# Altium footprint library Connector_Samtec_HLE_THT.PcbLib: 141 footprints (part 4 of 9)
Each footprint in its own frame and in the unit in brackets; x right, y up, seen from the top. Pads: shape width x height; smd on the part's side, far side on the other; paste and mask are expansions set on the pad; w line width, h text height; cw(c..) or ccw(c..) is an arc to the next point about the centre after c.
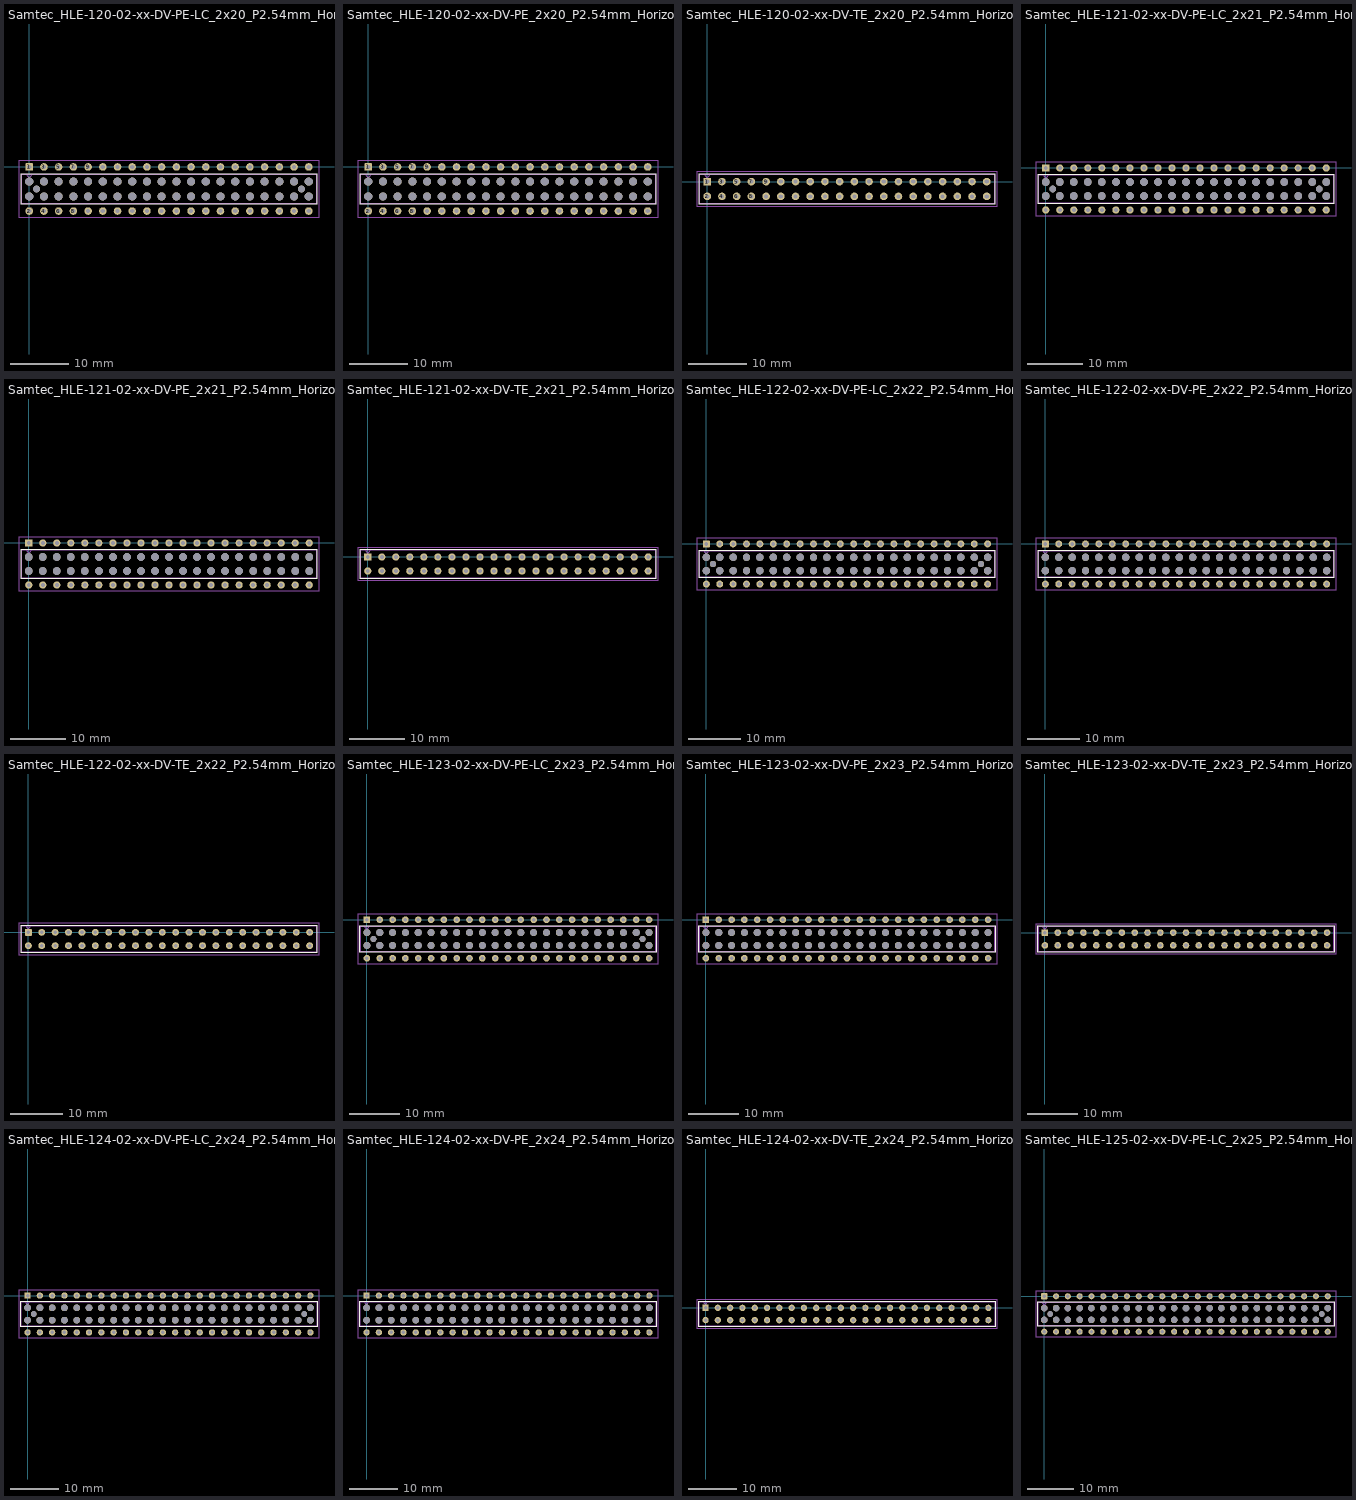
[diagram p3: the footprints below, top view; thin cyan lines are the x and y axes]

## Samtec_HLE-120-02-xx-DV-PE-LC_2x20_P2.54mm_Horizontal [mm]
pads (82):
  rrect19% 1.31x1.31 hole 0.71: 1(0,0)
  round 1.31 hole 0.71: 2(0,-7.62) 3(2.54,0) 4(2.54,-7.62) 5(5.08,0) 6(5.08,-7.62) 7(7.62,0) 8(7.62,-7.62) 9(10.16,0) 10(10.16,-7.62) 11(12.7,0) 12(12.7,-7.62) 13(15.24,0) 14(15.24,-7.62) 15(17.78,0) 16(17.78,-7.62) 17(20.32,0) 18(20.32,-7.62) 19(22.86,0) 20(22.86,-7.62) 21(25.4,0) 22(25.4,-7.62) 23(27.94,0) 24(27.94,-7.62) 25(30.48,0) 26(30.48,-7.62) 27(33.02,0) 28(33.02,-7.62) 29(35.56,0) 30(35.56,-7.62) 31(38.1,0) 32(38.1,-7.62) 33(40.64,0) 34(40.64,-7.62) 35(43.18,0) 36(43.18,-7.62) 37(45.72,0) 38(45.72,-7.62) 39(48.26,0) 40(48.26,-7.62)
  round 1.4 hole 1.4: Un1(48.26,-2.54) Un2(2.54,-2.54) Un3(40.64,-5.08) Un4(35.56,-5.08) Un5(40.64,-2.54) Un6(35.56,-2.54) Un7(10.16,-2.54) Un8(20.32,-2.54) Un9(0,-2.54) Un10(25.4,-5.08) Un11(43.18,-5.08) Un12(12.7,-5.08) Un14(38.1,-5.08) Un15(22.86,-2.54) Un16(38.1,-2.54) Un17(12.7,-2.54) Un18(27.94,-5.08) Un19(45.72,-5.08) Un20(17.78,-5.08) Un21(25.4,-2.54) Un22(48.26,-5.08) Un23(43.18,-2.54) Un24(30.48,-5.08) Un25(27.94,-2.54) Un26(33.02,-5.08) Un27(15.24,-2.54) Un28(7.62,-5.08) Un29(15.24,-5.08) Un30(22.86,-5.08) Un31(17.78,-2.54) Un32(45.72,-2.54) Un33(5.08,-5.08) Un34(30.48,-2.54) Un35(10.16,-5.08) Un36(33.02,-2.54) Un37(5.08,-2.54) Un39(7.62,-2.54) Un40(20.32,-5.08) Un41(0,-5.08) Un42(2.54,-5.08)
  round 1.19 hole 1.19: Un13(1.27,-3.81) Un38(46.99,-3.81)
F.SilkS:
  lines w0.12: -1.38,-6.46 49.64,-6.46 49.64,-1.16 -1.38,-1.16 -1.38,-6.46
F.CrtYd:
  lines w0.05: -1.77,-8.78 50.03,-8.78 50.03,1.16 -1.77,1.16 -1.77,-8.78
F.Fab:
  lines w0.1: -0.5,-1.27 0,-1.977 0.5,-1.27 ; -1.27,-6.35 49.53,-6.35 49.53,-1.27 -1.27,-1.27 -1.27,-6.35
  text "'.Designator'" at 20.083,-6.49 h1

## Samtec_HLE-120-02-xx-DV-PE_2x20_P2.54mm_Horizontal [mm]
pads (80):
  rrect19% 1.31x1.31 hole 0.71: 1(0,0)
  round 1.31 hole 0.71: 2(0,-7.62) 3(2.54,0) 4(2.54,-7.62) 5(5.08,0) 6(5.08,-7.62) 7(7.62,0) 8(7.62,-7.62) 9(10.16,0) 10(10.16,-7.62) 11(12.7,0) 12(12.7,-7.62) 13(15.24,0) 14(15.24,-7.62) 15(17.78,0) 16(17.78,-7.62) 17(20.32,0) 18(20.32,-7.62) 19(22.86,0) 20(22.86,-7.62) 21(25.4,0) 22(25.4,-7.62) 23(27.94,0) 24(27.94,-7.62) 25(30.48,0) 26(30.48,-7.62) 27(33.02,0) 28(33.02,-7.62) 29(35.56,0) 30(35.56,-7.62) 31(38.1,0) 32(38.1,-7.62) 33(40.64,0) 34(40.64,-7.62) 35(43.18,0) 36(43.18,-7.62) 37(45.72,0) 38(45.72,-7.62) 39(48.26,0) 40(48.26,-7.62)
  round 1.4 hole 1.4: Un1(20.32,-5.08) Un2(43.18,-5.08) Un3(2.54,-5.08) Un4(43.18,-2.54) Un5(48.26,-5.08) Un6(0,-2.54) Un7(35.56,-2.54) Un8(17.78,-5.08) Un9(38.1,-5.08) Un10(25.4,-2.54) Un11(22.86,-5.08) Un12(12.7,-2.54) Un13(45.72,-2.54) Un14(38.1,-2.54) Un15(12.7,-5.08) Un16(10.16,-5.08) Un17(0,-5.08) Un18(15.24,-2.54) Un19(2.54,-2.54) Un20(22.86,-2.54) Un21(7.62,-5.08) Un22(40.64,-2.54) Un23(48.26,-2.54) Un24(30.48,-2.54) Un25(5.08,-5.08) Un26(33.02,-2.54) Un27(7.62,-2.54) Un28(45.72,-5.08) Un29(27.94,-2.54) Un30(10.16,-2.54) Un31(25.4,-5.08) Un32(35.56,-5.08) Un33(17.78,-2.54) Un34(40.64,-5.08) Un35(15.24,-5.08) Un36(20.32,-2.54) Un37(30.48,-5.08) Un38(33.02,-5.08) Un39(5.08,-2.54) Un40(27.94,-5.08)
F.SilkS:
  lines w0.12: -1.38,-6.46 -1.38,-1.16 49.64,-1.16 49.64,-6.46 -1.38,-6.46
F.CrtYd:
  lines w0.05: -1.77,-8.78 50.03,-8.78 50.03,1.16 -1.77,1.16 -1.77,-8.78
F.Fab:
  lines w0.1: -0.5,-1.27 0,-1.977 0.5,-1.27 ; -1.27,-6.35 -1.27,-1.27 49.53,-1.27 49.53,-6.35 -1.27,-6.35
  text "'.Designator'" at 20.083,-6.49 h1

## Samtec_HLE-120-02-xx-DV-TE_2x20_P2.54mm_Horizontal [mm]
pads (40):
  rrect19% 1.31x1.31 hole 0.71: 1(0,0)
  round 1.31 hole 0.71: 2(0,-2.54) 3(2.54,0) 4(2.54,-2.54) 5(5.08,0) 6(5.08,-2.54) 7(7.62,0) 8(7.62,-2.54) 9(10.16,0) 10(10.16,-2.54) 11(12.7,0) 12(12.7,-2.54) 13(15.24,0) 14(15.24,-2.54) 15(17.78,0) 16(17.78,-2.54) 17(20.32,0) 18(20.32,-2.54) 19(22.86,0) 20(22.86,-2.54) 21(25.4,0) 22(25.4,-2.54) 23(27.94,0) 24(27.94,-2.54) 25(30.48,0) 26(30.48,-2.54) 27(33.02,0) 28(33.02,-2.54) 29(35.56,0) 30(35.56,-2.54) 31(38.1,0) 32(38.1,-2.54) 33(40.64,0) 34(40.64,-2.54) 35(43.18,0) 36(43.18,-2.54) 37(45.72,0) 38(45.72,-2.54) 39(48.26,0) 40(48.26,-2.54)
F.SilkS:
  lines w0.12: -1.38,-3.92 49.64,-3.92 49.64,1.38 -1.38,1.38 -1.38,-3.92
F.CrtYd:
  lines w0.05: -1.77,-4.31 -1.77,1.77 50.03,1.77 50.03,-4.31 -1.77,-4.31
F.Fab:
  lines w0.1: -0.5,1.27 0,0.563 0.5,1.27 ; -1.27,-3.81 -1.27,1.27 49.53,1.27 49.53,-3.81 -1.27,-3.81
  text "'.Designator'" at 20.083,-3.95 h1

## Samtec_HLE-121-02-xx-DV-PE-LC_2x21_P2.54mm_Horizontal [mm]
pads (86):
  rrect19% 1.31x1.31 hole 0.71: 1(0,0)
  round 1.31 hole 0.71: 2(0,-7.62) 3(2.54,0) 4(2.54,-7.62) 5(5.08,0) 6(5.08,-7.62) 7(7.62,0) 8(7.62,-7.62) 9(10.16,0) 10(10.16,-7.62) 11(12.7,0) 12(12.7,-7.62) 13(15.24,0) 14(15.24,-7.62) 15(17.78,0) 16(17.78,-7.62) 17(20.32,0) 18(20.32,-7.62) 19(22.86,0) 20(22.86,-7.62) 21(25.4,0) 22(25.4,-7.62) 23(27.94,0) 24(27.94,-7.62) 25(30.48,0) 26(30.48,-7.62) 27(33.02,0) 28(33.02,-7.62) 29(35.56,0) 30(35.56,-7.62) 31(38.1,0) 32(38.1,-7.62) 33(40.64,0) 34(40.64,-7.62) 35(43.18,0) 36(43.18,-7.62) 37(45.72,0) 38(45.72,-7.62) 39(48.26,0) 40(48.26,-7.62) 41(50.8,0) 42(50.8,-7.62)
  round 1.19 hole 1.19: Un1(1.27,-3.81) Un37(49.53,-3.81)
  round 1.4 hole 1.4: Un2(2.54,-2.54) Un3(15.24,-5.08) Un4(17.78,-2.54) Un5(27.94,-5.08) Un6(0,-2.54) Un7(48.26,-2.54) Un8(33.02,-2.54) Un9(38.1,-2.54) Un10(50.8,-5.08) Un11(35.56,-5.08) Un12(20.32,-5.08) Un13(45.72,-2.54) Un14(35.56,-2.54) Un15(43.18,-2.54) Un16(0,-5.08) Un17(38.1,-5.08) Un18(15.24,-2.54) Un19(10.16,-2.54) Un20(40.64,-5.08) Un21(30.48,-5.08) Un22(45.72,-5.08) Un23(48.26,-5.08) Un24(12.7,-5.08) Un25(20.32,-2.54) Un26(12.7,-2.54) Un27(40.64,-2.54) Un28(33.02,-5.08) Un29(22.86,-2.54) Un30(27.94,-2.54) Un31(17.78,-5.08) Un32(25.4,-5.08) Un33(30.48,-2.54) Un34(7.62,-5.08) Un35(22.86,-5.08) Un36(50.8,-2.54) Un38(2.54,-5.08) Un39(10.16,-5.08) Un40(25.4,-2.54) Un41(5.08,-2.54) Un42(43.18,-5.08) Un43(7.62,-2.54) Un44(5.08,-5.08)
F.SilkS:
  lines w0.12: -1.38,-6.46 52.18,-6.46 52.18,-1.16 -1.38,-1.16 -1.38,-6.46
F.CrtYd:
  lines w0.05: -1.77,-8.78 52.57,-8.78 52.57,1.16 -1.77,1.16 -1.77,-8.78
F.Fab:
  lines w0.1: -0.5,-1.27 0,-1.977 0.5,-1.27 ; -1.27,-6.35 52.07,-6.35 52.07,-1.27 -1.27,-1.27 -1.27,-6.35
  text "'.Designator'" at 21.353,-6.49 h1

## Samtec_HLE-121-02-xx-DV-PE_2x21_P2.54mm_Horizontal [mm]
pads (84):
  rrect19% 1.31x1.31 hole 0.71: 1(0,0)
  round 1.31 hole 0.71: 2(0,-7.62) 3(2.54,0) 4(2.54,-7.62) 5(5.08,0) 6(5.08,-7.62) 7(7.62,0) 8(7.62,-7.62) 9(10.16,0) 10(10.16,-7.62) 11(12.7,0) 12(12.7,-7.62) 13(15.24,0) 14(15.24,-7.62) 15(17.78,0) 16(17.78,-7.62) 17(20.32,0) 18(20.32,-7.62) 19(22.86,0) 20(22.86,-7.62) 21(25.4,0) 22(25.4,-7.62) 23(27.94,0) 24(27.94,-7.62) 25(30.48,0) 26(30.48,-7.62) 27(33.02,0) 28(33.02,-7.62) 29(35.56,0) 30(35.56,-7.62) 31(38.1,0) 32(38.1,-7.62) 33(40.64,0) 34(40.64,-7.62) 35(43.18,0) 36(43.18,-7.62) 37(45.72,0) 38(45.72,-7.62) 39(48.26,0) 40(48.26,-7.62) 41(50.8,0) 42(50.8,-7.62)
  round 1.4 hole 1.4: Un1(15.24,-2.54) Un2(48.26,-2.54) Un3(35.56,-5.08) Un4(33.02,-2.54) Un5(0,-5.08) Un6(10.16,-5.08) Un7(15.24,-5.08) Un8(5.08,-2.54) Un9(48.26,-5.08) Un10(7.62,-5.08) Un11(43.18,-2.54) Un12(10.16,-2.54) Un13(45.72,-5.08) Un14(50.8,-5.08) Un15(25.4,-2.54) Un16(5.08,-5.08) Un17(20.32,-5.08) Un18(33.02,-5.08) Un19(35.56,-2.54) Un20(43.18,-5.08) Un21(30.48,-5.08) Un22(27.94,-5.08) Un23(0,-2.54) Un24(25.4,-5.08) Un25(20.32,-2.54) Un26(12.7,-2.54) Un27(2.54,-2.54) Un28(27.94,-2.54) Un29(2.54,-5.08) Un30(30.48,-2.54) Un31(22.86,-5.08) Un32(50.8,-2.54) Un33(22.86,-2.54) Un34(7.62,-2.54) Un35(17.78,-5.08) Un36(40.64,-5.08) Un37(45.72,-2.54) Un38(38.1,-2.54) Un39(12.7,-5.08) Un40(38.1,-5.08) Un41(17.78,-2.54) Un42(40.64,-2.54)
F.SilkS:
  lines w0.12: -1.38,-6.46 52.18,-6.46 52.18,-1.16 -1.38,-1.16 -1.38,-6.46
F.CrtYd:
  lines w0.05: -1.77,-8.78 -1.77,1.16 52.57,1.16 52.57,-8.78 -1.77,-8.78
F.Fab:
  lines w0.1: -0.5,-1.27 0,-1.977 0.5,-1.27 ; -1.27,-6.35 52.07,-6.35 52.07,-1.27 -1.27,-1.27 -1.27,-6.35
  text "'.Designator'" at 21.353,-6.49 h1

## Samtec_HLE-121-02-xx-DV-TE_2x21_P2.54mm_Horizontal [mm]
pads (42):
  rrect19% 1.31x1.31 hole 0.71: 1(0,0)
  round 1.31 hole 0.71: 2(0,-2.54) 3(2.54,0) 4(2.54,-2.54) 5(5.08,0) 6(5.08,-2.54) 7(7.62,0) 8(7.62,-2.54) 9(10.16,0) 10(10.16,-2.54) 11(12.7,0) 12(12.7,-2.54) 13(15.24,0) 14(15.24,-2.54) 15(17.78,0) 16(17.78,-2.54) 17(20.32,0) 18(20.32,-2.54) 19(22.86,0) 20(22.86,-2.54) 21(25.4,0) 22(25.4,-2.54) 23(27.94,0) 24(27.94,-2.54) 25(30.48,0) 26(30.48,-2.54) 27(33.02,0) 28(33.02,-2.54) 29(35.56,0) 30(35.56,-2.54) 31(38.1,0) 32(38.1,-2.54) 33(40.64,0) 34(40.64,-2.54) 35(43.18,0) 36(43.18,-2.54) 37(45.72,0) 38(45.72,-2.54) 39(48.26,0) 40(48.26,-2.54) 41(50.8,0) 42(50.8,-2.54)
F.SilkS:
  lines w0.12: -1.38,-3.92 52.18,-3.92 52.18,1.38 -1.38,1.38 -1.38,-3.92
F.CrtYd:
  lines w0.05: -1.77,-4.31 52.57,-4.31 52.57,1.77 -1.77,1.77 -1.77,-4.31
F.Fab:
  lines w0.1: -0.5,1.27 0,0.563 0.5,1.27 ; -1.27,-3.81 52.07,-3.81 52.07,1.27 -1.27,1.27 -1.27,-3.81
  text "'.Designator'" at 21.353,-3.95 h1

## Samtec_HLE-122-02-xx-DV-PE-LC_2x22_P2.54mm_Horizontal [mm]
pads (90):
  rrect19% 1.31x1.31 hole 0.71: 1(0,0)
  round 1.31 hole 0.71: 2(0,-7.62) 3(2.54,0) 4(2.54,-7.62) 5(5.08,0) 6(5.08,-7.62) 7(7.62,0) 8(7.62,-7.62) 9(10.16,0) 10(10.16,-7.62) 11(12.7,0) 12(12.7,-7.62) 13(15.24,0) 14(15.24,-7.62) 15(17.78,0) 16(17.78,-7.62) 17(20.32,0) 18(20.32,-7.62) 19(22.86,0) 20(22.86,-7.62) 21(25.4,0) 22(25.4,-7.62) 23(27.94,0) 24(27.94,-7.62) 25(30.48,0) 26(30.48,-7.62) 27(33.02,0) 28(33.02,-7.62) 29(35.56,0) 30(35.56,-7.62) 31(38.1,0) 32(38.1,-7.62) 33(40.64,0) 34(40.64,-7.62) 35(43.18,0) 36(43.18,-7.62) 37(45.72,0) 38(45.72,-7.62) 39(48.26,0) 40(48.26,-7.62) 41(50.8,0) 42(50.8,-7.62) 43(53.34,0) 44(53.34,-7.62)
  round 1.4 hole 1.4: Un1(27.94,-2.54) Un2(7.62,-5.08) Un3(15.24,-2.54) Un4(0,-5.08) Un5(35.56,-2.54) Un6(30.48,-2.54) Un7(17.78,-2.54) Un8(22.86,-2.54) Un9(12.7,-5.08) Un10(25.4,-2.54) Un11(15.24,-5.08) Un12(20.32,-5.08) Un13(38.1,-2.54) Un14(0,-2.54) Un15(7.62,-2.54) Un16(38.1,-5.08) Un17(25.4,-5.08) Un18(48.26,-5.08) Un20(30.48,-5.08) Un21(10.16,-5.08) Un22(5.08,-2.54) Un23(45.72,-5.08) Un24(10.16,-2.54) Un25(2.54,-5.08) Un26(45.72,-2.54) Un27(50.8,-5.08) Un28(17.78,-5.08) Un29(12.7,-2.54) Un30(2.54,-2.54) Un31(5.08,-5.08) Un33(53.34,-5.08) Un34(50.8,-2.54) Un35(43.18,-5.08) Un36(53.34,-2.54) Un37(40.64,-2.54) Un38(43.18,-2.54) Un39(20.32,-2.54) Un40(48.26,-2.54) Un41(40.64,-5.08) Un42(35.56,-5.08) Un43(33.02,-2.54) Un44(22.86,-5.08) Un45(27.94,-5.08) Un46(33.02,-5.08)
  round 1.19 hole 1.19: Un19(52.07,-3.81) Un32(1.27,-3.81)
F.SilkS:
  lines w0.12: -1.38,-6.46 -1.38,-1.16 54.72,-1.16 54.72,-6.46 -1.38,-6.46
F.CrtYd:
  lines w0.05: -1.77,-8.78 55.11,-8.78 55.11,1.16 -1.77,1.16 -1.77,-8.78
F.Fab:
  lines w0.1: -0.5,-1.27 0,-1.977 0.5,-1.27 ; -1.27,-6.35 -1.27,-1.27 54.61,-1.27 54.61,-6.35 -1.27,-6.35
  text "'.Designator'" at 22.623,-6.49 h1

## Samtec_HLE-122-02-xx-DV-PE_2x22_P2.54mm_Horizontal [mm]
pads (88):
  rrect19% 1.31x1.31 hole 0.71: 1(0,0)
  round 1.31 hole 0.71: 2(0,-7.62) 3(2.54,0) 4(2.54,-7.62) 5(5.08,0) 6(5.08,-7.62) 7(7.62,0) 8(7.62,-7.62) 9(10.16,0) 10(10.16,-7.62) 11(12.7,0) 12(12.7,-7.62) 13(15.24,0) 14(15.24,-7.62) 15(17.78,0) 16(17.78,-7.62) 17(20.32,0) 18(20.32,-7.62) 19(22.86,0) 20(22.86,-7.62) 21(25.4,0) 22(25.4,-7.62) 23(27.94,0) 24(27.94,-7.62) 25(30.48,0) 26(30.48,-7.62) 27(33.02,0) 28(33.02,-7.62) 29(35.56,0) 30(35.56,-7.62) 31(38.1,0) 32(38.1,-7.62) 33(40.64,0) 34(40.64,-7.62) 35(43.18,0) 36(43.18,-7.62) 37(45.72,0) 38(45.72,-7.62) 39(48.26,0) 40(48.26,-7.62) 41(50.8,0) 42(50.8,-7.62) 43(53.34,0) 44(53.34,-7.62)
  round 1.4 hole 1.4: Un1(45.72,-2.54) Un2(50.8,-5.08) Un3(30.48,-5.08) Un4(20.32,-5.08) Un5(22.86,-2.54) Un6(12.7,-5.08) Un7(0,-5.08) Un8(2.54,-5.08) Un9(10.16,-5.08) Un10(2.54,-2.54) Un11(33.02,-5.08) Un12(10.16,-2.54) Un13(27.94,-2.54) Un14(38.1,-2.54) Un15(30.48,-2.54) Un16(40.64,-2.54) Un17(53.34,-2.54) Un18(15.24,-5.08) Un19(40.64,-5.08) Un20(35.56,-5.08) Un21(33.02,-2.54) Un22(43.18,-2.54) Un23(53.34,-5.08) Un24(48.26,-5.08) Un25(25.4,-2.54) Un26(17.78,-5.08) Un27(0,-2.54) Un28(43.18,-5.08) Un29(12.7,-2.54) Un30(45.72,-5.08) Un31(5.08,-2.54) Un32(48.26,-2.54) Un33(7.62,-5.08) Un34(50.8,-2.54) Un35(5.08,-5.08) Un36(20.32,-2.54) Un37(27.94,-5.08) Un38(15.24,-2.54) Un39(22.86,-5.08) Un40(17.78,-2.54) Un41(25.4,-5.08) Un42(35.56,-2.54) Un43(7.62,-2.54) Un44(38.1,-5.08)
F.SilkS:
  lines w0.12: -1.38,-6.46 54.72,-6.46 54.72,-1.16 -1.38,-1.16 -1.38,-6.46
F.CrtYd:
  lines w0.05: -1.77,-8.78 55.11,-8.78 55.11,1.16 -1.77,1.16 -1.77,-8.78
F.Fab:
  lines w0.1: -0.5,-1.27 0,-1.977 0.5,-1.27 ; -1.27,-6.35 -1.27,-1.27 54.61,-1.27 54.61,-6.35 -1.27,-6.35
  text "'.Designator'" at 22.623,-6.49 h1

## Samtec_HLE-122-02-xx-DV-TE_2x22_P2.54mm_Horizontal [mm]
pads (44):
  rrect19% 1.31x1.31 hole 0.71: 1(0,0)
  round 1.31 hole 0.71: 2(0,-2.54) 3(2.54,0) 4(2.54,-2.54) 5(5.08,0) 6(5.08,-2.54) 7(7.62,0) 8(7.62,-2.54) 9(10.16,0) 10(10.16,-2.54) 11(12.7,0) 12(12.7,-2.54) 13(15.24,0) 14(15.24,-2.54) 15(17.78,0) 16(17.78,-2.54) 17(20.32,0) 18(20.32,-2.54) 19(22.86,0) 20(22.86,-2.54) 21(25.4,0) 22(25.4,-2.54) 23(27.94,0) 24(27.94,-2.54) 25(30.48,0) 26(30.48,-2.54) 27(33.02,0) 28(33.02,-2.54) 29(35.56,0) 30(35.56,-2.54) 31(38.1,0) 32(38.1,-2.54) 33(40.64,0) 34(40.64,-2.54) 35(43.18,0) 36(43.18,-2.54) 37(45.72,0) 38(45.72,-2.54) 39(48.26,0) 40(48.26,-2.54) 41(50.8,0) 42(50.8,-2.54) 43(53.34,0) 44(53.34,-2.54)
F.SilkS:
  lines w0.12: -1.38,-3.92 54.72,-3.92 54.72,1.38 -1.38,1.38 -1.38,-3.92
F.CrtYd:
  lines w0.05: -1.77,-4.31 -1.77,1.77 55.11,1.77 55.11,-4.31 -1.77,-4.31
F.Fab:
  lines w0.1: -0.5,1.27 0,0.563 0.5,1.27 ; -1.27,-3.81 -1.27,1.27 54.61,1.27 54.61,-3.81 -1.27,-3.81
  text "'.Designator'" at 22.623,-3.95 h1

## Samtec_HLE-123-02-xx-DV-PE-LC_2x23_P2.54mm_Horizontal [mm]
pads (94):
  rrect19% 1.31x1.31 hole 0.71: 1(0,0)
  round 1.31 hole 0.71: 2(0,-7.62) 3(2.54,0) 4(2.54,-7.62) 5(5.08,0) 6(5.08,-7.62) 7(7.62,0) 8(7.62,-7.62) 9(10.16,0) 10(10.16,-7.62) 11(12.7,0) 12(12.7,-7.62) 13(15.24,0) 14(15.24,-7.62) 15(17.78,0) 16(17.78,-7.62) 17(20.32,0) 18(20.32,-7.62) 19(22.86,0) 20(22.86,-7.62) 21(25.4,0) 22(25.4,-7.62) 23(27.94,0) 24(27.94,-7.62) 25(30.48,0) 26(30.48,-7.62) 27(33.02,0) 28(33.02,-7.62) 29(35.56,0) 30(35.56,-7.62) 31(38.1,0) 32(38.1,-7.62) 33(40.64,0) 34(40.64,-7.62) 35(43.18,0) 36(43.18,-7.62) 37(45.72,0) 38(45.72,-7.62) 39(48.26,0) 40(48.26,-7.62) 41(50.8,0) 42(50.8,-7.62) 43(53.34,0) 44(53.34,-7.62) 45(55.88,0) 46(55.88,-7.62)
  round 1.4 hole 1.4: Un1(43.18,-5.08) Un2(5.08,-2.54) Un3(2.54,-2.54) Un4(10.16,-2.54) Un5(53.34,-5.08) Un6(7.62,-2.54) Un7(17.78,-5.08) Un8(40.64,-2.54) Un9(27.94,-5.08) Un10(0,-5.08) Un11(22.86,-2.54) Un12(55.88,-5.08) Un13(7.62,-5.08) Un14(48.26,-2.54) Un15(0,-2.54) Un16(48.26,-5.08) Un17(30.48,-5.08) Un18(30.48,-2.54) Un19(12.7,-2.54) Un20(15.24,-5.08) Un21(45.72,-2.54) Un23(25.4,-2.54) Un24(12.7,-5.08) Un25(38.1,-5.08) Un27(20.32,-2.54) Un28(43.18,-2.54) Un29(10.16,-5.08) Un30(35.56,-5.08) Un31(27.94,-2.54) Un32(15.24,-2.54) Un33(40.64,-5.08) Un34(25.4,-5.08) Un35(45.72,-5.08) Un36(33.02,-5.08) Un37(5.08,-5.08) Un38(22.86,-5.08) Un39(33.02,-2.54) Un40(55.88,-2.54) Un41(20.32,-5.08) Un42(38.1,-2.54) Un43(17.78,-2.54) Un44(50.8,-2.54) Un45(2.54,-5.08) Un46(35.56,-2.54) Un47(50.8,-5.08) Un48(53.34,-2.54)
  round 1.19 hole 1.19: Un22(54.61,-3.81) Un26(1.27,-3.81)
F.SilkS:
  lines w0.12: -1.38,-6.46 -1.38,-1.16 57.26,-1.16 57.26,-6.46 -1.38,-6.46
F.CrtYd:
  lines w0.05: -1.77,-8.78 -1.77,1.16 57.65,1.16 57.65,-8.78 -1.77,-8.78
F.Fab:
  lines w0.1: -0.5,-1.27 0,-1.977 0.5,-1.27 ; -1.27,-6.35 57.15,-6.35 57.15,-1.27 -1.27,-1.27 -1.27,-6.35
  text "'.Designator'" at 23.893,-6.49 h1

## Samtec_HLE-123-02-xx-DV-PE_2x23_P2.54mm_Horizontal [mm]
pads (92):
  rrect19% 1.31x1.31 hole 0.71: 1(0,0)
  round 1.31 hole 0.71: 2(0,-7.62) 3(2.54,0) 4(2.54,-7.62) 5(5.08,0) 6(5.08,-7.62) 7(7.62,0) 8(7.62,-7.62) 9(10.16,0) 10(10.16,-7.62) 11(12.7,0) 12(12.7,-7.62) 13(15.24,0) 14(15.24,-7.62) 15(17.78,0) 16(17.78,-7.62) 17(20.32,0) 18(20.32,-7.62) 19(22.86,0) 20(22.86,-7.62) 21(25.4,0) 22(25.4,-7.62) 23(27.94,0) 24(27.94,-7.62) 25(30.48,0) 26(30.48,-7.62) 27(33.02,0) 28(33.02,-7.62) 29(35.56,0) 30(35.56,-7.62) 31(38.1,0) 32(38.1,-7.62) 33(40.64,0) 34(40.64,-7.62) 35(43.18,0) 36(43.18,-7.62) 37(45.72,0) 38(45.72,-7.62) 39(48.26,0) 40(48.26,-7.62) 41(50.8,0) 42(50.8,-7.62) 43(53.34,0) 44(53.34,-7.62) 45(55.88,0) 46(55.88,-7.62)
  round 1.4 hole 1.4: Un1(35.56,-5.08) Un2(40.64,-5.08) Un3(10.16,-5.08) Un4(7.62,-5.08) Un5(50.8,-2.54) Un6(53.34,-5.08) Un7(45.72,-5.08) Un8(5.08,-2.54) Un9(2.54,-2.54) Un10(2.54,-5.08) Un11(17.78,-5.08) Un12(30.48,-2.54) Un13(38.1,-2.54) Un14(25.4,-2.54) Un15(33.02,-5.08) Un16(25.4,-5.08) Un17(43.18,-2.54) Un18(38.1,-5.08) Un19(33.02,-2.54) Un20(15.24,-5.08) Un21(17.78,-2.54) Un22(22.86,-5.08) Un23(45.72,-2.54) Un24(55.88,-5.08) Un25(22.86,-2.54) Un26(30.48,-5.08) Un27(7.62,-2.54) Un28(20.32,-5.08) Un29(5.08,-5.08) Un30(53.34,-2.54) Un31(20.32,-2.54) Un32(12.7,-5.08) Un33(40.64,-2.54) Un34(35.56,-2.54) Un35(43.18,-5.08) Un36(0,-2.54) Un37(50.8,-5.08) Un38(55.88,-2.54) Un39(15.24,-2.54) Un40(27.94,-5.08) Un41(48.26,-5.08) Un42(12.7,-2.54) Un43(0,-5.08) Un44(48.26,-2.54) Un45(10.16,-2.54) Un46(27.94,-2.54)
F.SilkS:
  lines w0.12: -1.38,-6.46 -1.38,-1.16 57.26,-1.16 57.26,-6.46 -1.38,-6.46
F.CrtYd:
  lines w0.05: -1.77,-8.78 -1.77,1.16 57.65,1.16 57.65,-8.78 -1.77,-8.78
F.Fab:
  lines w0.1: -0.5,-1.27 0,-1.977 0.5,-1.27 ; -1.27,-6.35 57.15,-6.35 57.15,-1.27 -1.27,-1.27 -1.27,-6.35
  text "'.Designator'" at 23.893,-6.49 h1

## Samtec_HLE-123-02-xx-DV-TE_2x23_P2.54mm_Horizontal [mm]
pads (46):
  rrect19% 1.31x1.31 hole 0.71: 1(0,0)
  round 1.31 hole 0.71: 2(0,-2.54) 3(2.54,0) 4(2.54,-2.54) 5(5.08,0) 6(5.08,-2.54) 7(7.62,0) 8(7.62,-2.54) 9(10.16,0) 10(10.16,-2.54) 11(12.7,0) 12(12.7,-2.54) 13(15.24,0) 14(15.24,-2.54) 15(17.78,0) 16(17.78,-2.54) 17(20.32,0) 18(20.32,-2.54) 19(22.86,0) 20(22.86,-2.54) 21(25.4,0) 22(25.4,-2.54) 23(27.94,0) 24(27.94,-2.54) 25(30.48,0) 26(30.48,-2.54) 27(33.02,0) 28(33.02,-2.54) 29(35.56,0) 30(35.56,-2.54) 31(38.1,0) 32(38.1,-2.54) 33(40.64,0) 34(40.64,-2.54) 35(43.18,0) 36(43.18,-2.54) 37(45.72,0) 38(45.72,-2.54) 39(48.26,0) 40(48.26,-2.54) 41(50.8,0) 42(50.8,-2.54) 43(53.34,0) 44(53.34,-2.54) 45(55.88,0) 46(55.88,-2.54)
F.SilkS:
  lines w0.12: -1.38,-3.92 -1.38,1.38 57.26,1.38 57.26,-3.92 -1.38,-3.92
F.CrtYd:
  lines w0.05: -1.77,-4.31 -1.77,1.77 57.65,1.77 57.65,-4.31 -1.77,-4.31
F.Fab:
  lines w0.1: -0.5,1.27 0,0.563 0.5,1.27 ; -1.27,-3.81 57.15,-3.81 57.15,1.27 -1.27,1.27 -1.27,-3.81
  text "'.Designator'" at 23.893,-3.95 h1

## Samtec_HLE-124-02-xx-DV-PE-LC_2x24_P2.54mm_Horizontal [mm]
pads (98):
  rrect19% 1.31x1.31 hole 0.71: 1(0,0)
  round 1.31 hole 0.71: 2(0,-7.62) 3(2.54,0) 4(2.54,-7.62) 5(5.08,0) 6(5.08,-7.62) 7(7.62,0) 8(7.62,-7.62) 9(10.16,0) 10(10.16,-7.62) 11(12.7,0) 12(12.7,-7.62) 13(15.24,0) 14(15.24,-7.62) 15(17.78,0) 16(17.78,-7.62) 17(20.32,0) 18(20.32,-7.62) 19(22.86,0) 20(22.86,-7.62) 21(25.4,0) 22(25.4,-7.62) 23(27.94,0) 24(27.94,-7.62) 25(30.48,0) 26(30.48,-7.62) 27(33.02,0) 28(33.02,-7.62) 29(35.56,0) 30(35.56,-7.62) 31(38.1,0) 32(38.1,-7.62) 33(40.64,0) 34(40.64,-7.62) 35(43.18,0) 36(43.18,-7.62) 37(45.72,0) 38(45.72,-7.62) 39(48.26,0) 40(48.26,-7.62) 41(50.8,0) 42(50.8,-7.62) 43(53.34,0) 44(53.34,-7.62) 45(55.88,0) 46(55.88,-7.62) 47(58.42,0) 48(58.42,-7.62)
  round 1.4 hole 1.4: Un1(12.7,-2.54) Un2(58.42,-5.08) Un3(0,-5.08) Un4(33.02,-5.08) Un5(7.62,-5.08) Un6(5.08,-2.54) Un7(20.32,-2.54) Un8(15.24,-5.08) Un9(27.94,-2.54) Un10(2.54,-2.54) Un11(15.24,-2.54) Un12(30.48,-2.54) Un13(0,-2.54) Un14(10.16,-2.54) Un16(58.42,-2.54) Un17(35.56,-5.08) Un18(33.02,-2.54) Un20(17.78,-5.08) Un21(50.8,-2.54) Un22(35.56,-2.54) Un23(25.4,-2.54) Un24(38.1,-5.08) Un25(30.48,-5.08) Un26(27.94,-5.08) Un27(20.32,-5.08) Un28(40.64,-2.54) Un29(12.7,-5.08) Un30(55.88,-2.54) Un31(38.1,-2.54) Un32(55.88,-5.08) Un33(17.78,-2.54) Un34(7.62,-2.54) Un35(5.08,-5.08) Un36(48.26,-2.54) Un37(43.18,-5.08) Un38(10.16,-5.08) Un39(50.8,-5.08) Un40(48.26,-5.08) Un41(45.72,-5.08) Un42(45.72,-2.54) Un43(22.86,-5.08) Un44(53.34,-5.08) Un45(43.18,-2.54) Un46(22.86,-2.54) Un47(53.34,-2.54) Un48(25.4,-5.08) Un49(2.54,-5.08) Un50(40.64,-5.08)
  round 1.19 hole 1.19: Un15(57.15,-3.81) Un19(1.27,-3.81)
F.SilkS:
  lines w0.12: -1.38,-6.46 -1.38,-1.16 59.8,-1.16 59.8,-6.46 -1.38,-6.46
F.CrtYd:
  lines w0.05: -1.77,-8.78 -1.77,1.16 60.19,1.16 60.19,-8.78 -1.77,-8.78
F.Fab:
  lines w0.1: -0.5,-1.27 0,-1.977 0.5,-1.27 ; -1.27,-6.35 -1.27,-1.27 59.69,-1.27 59.69,-6.35 -1.27,-6.35
  text "'.Designator'" at 25.163,-6.49 h1

## Samtec_HLE-124-02-xx-DV-PE_2x24_P2.54mm_Horizontal [mm]
pads (96):
  rrect19% 1.31x1.31 hole 0.71: 1(0,0)
  round 1.31 hole 0.71: 2(0,-7.62) 3(2.54,0) 4(2.54,-7.62) 5(5.08,0) 6(5.08,-7.62) 7(7.62,0) 8(7.62,-7.62) 9(10.16,0) 10(10.16,-7.62) 11(12.7,0) 12(12.7,-7.62) 13(15.24,0) 14(15.24,-7.62) 15(17.78,0) 16(17.78,-7.62) 17(20.32,0) 18(20.32,-7.62) 19(22.86,0) 20(22.86,-7.62) 21(25.4,0) 22(25.4,-7.62) 23(27.94,0) 24(27.94,-7.62) 25(30.48,0) 26(30.48,-7.62) 27(33.02,0) 28(33.02,-7.62) 29(35.56,0) 30(35.56,-7.62) 31(38.1,0) 32(38.1,-7.62) 33(40.64,0) 34(40.64,-7.62) 35(43.18,0) 36(43.18,-7.62) 37(45.72,0) 38(45.72,-7.62) 39(48.26,0) 40(48.26,-7.62) 41(50.8,0) 42(50.8,-7.62) 43(53.34,0) 44(53.34,-7.62) 45(55.88,0) 46(55.88,-7.62) 47(58.42,0) 48(58.42,-7.62)
  round 1.4 hole 1.4: Un1(38.1,-5.08) Un2(25.4,-2.54) Un3(33.02,-5.08) Un4(58.42,-2.54) Un5(55.88,-2.54) Un6(38.1,-2.54) Un7(35.56,-5.08) Un8(7.62,-5.08) Un9(17.78,-2.54) Un10(15.24,-2.54) Un11(35.56,-2.54) Un12(50.8,-5.08) Un13(27.94,-5.08) Un14(0,-5.08) Un15(33.02,-2.54) Un16(10.16,-5.08) Un17(27.94,-2.54) Un18(55.88,-5.08) Un19(12.7,-5.08) Un20(58.42,-5.08) Un21(45.72,-2.54) Un22(22.86,-5.08) Un23(25.4,-5.08) Un24(20.32,-2.54) Un25(43.18,-2.54) Un26(17.78,-5.08) Un27(22.86,-2.54) Un28(48.26,-5.08) Un29(10.16,-2.54) Un30(50.8,-2.54) Un31(53.34,-5.08) Un32(7.62,-2.54) Un33(5.08,-2.54) Un34(45.72,-5.08) Un35(5.08,-5.08) Un36(30.48,-2.54) Un37(12.7,-2.54) Un38(20.32,-5.08) Un39(43.18,-5.08) Un40(40.64,-2.54) Un41(2.54,-2.54) Un42(48.26,-2.54) Un43(15.24,-5.08) Un44(40.64,-5.08) Un45(0,-2.54) Un46(2.54,-5.08) Un47(53.34,-2.54) Un48(30.48,-5.08)
F.SilkS:
  lines w0.12: -1.38,-6.46 -1.38,-1.16 59.8,-1.16 59.8,-6.46 -1.38,-6.46
F.CrtYd:
  lines w0.05: -1.77,-8.78 -1.77,1.16 60.19,1.16 60.19,-8.78 -1.77,-8.78
F.Fab:
  lines w0.1: -0.5,-1.27 0,-1.977 0.5,-1.27 ; -1.27,-6.35 -1.27,-1.27 59.69,-1.27 59.69,-6.35 -1.27,-6.35
  text "'.Designator'" at 25.163,-6.49 h1

## Samtec_HLE-124-02-xx-DV-TE_2x24_P2.54mm_Horizontal [mm]
pads (48):
  rrect19% 1.31x1.31 hole 0.71: 1(0,0)
  round 1.31 hole 0.71: 2(0,-2.54) 3(2.54,0) 4(2.54,-2.54) 5(5.08,0) 6(5.08,-2.54) 7(7.62,0) 8(7.62,-2.54) 9(10.16,0) 10(10.16,-2.54) 11(12.7,0) 12(12.7,-2.54) 13(15.24,0) 14(15.24,-2.54) 15(17.78,0) 16(17.78,-2.54) 17(20.32,0) 18(20.32,-2.54) 19(22.86,0) 20(22.86,-2.54) 21(25.4,0) 22(25.4,-2.54) 23(27.94,0) 24(27.94,-2.54) 25(30.48,0) 26(30.48,-2.54) 27(33.02,0) 28(33.02,-2.54) 29(35.56,0) 30(35.56,-2.54) 31(38.1,0) 32(38.1,-2.54) 33(40.64,0) 34(40.64,-2.54) 35(43.18,0) 36(43.18,-2.54) 37(45.72,0) 38(45.72,-2.54) 39(48.26,0) 40(48.26,-2.54) 41(50.8,0) 42(50.8,-2.54) 43(53.34,0) 44(53.34,-2.54) 45(55.88,0) 46(55.88,-2.54) 47(58.42,0) 48(58.42,-2.54)
F.SilkS:
  lines w0.12: -1.38,-3.92 -1.38,1.38 59.8,1.38 59.8,-3.92 -1.38,-3.92
F.CrtYd:
  lines w0.05: -1.77,-4.31 60.19,-4.31 60.19,1.77 -1.77,1.77 -1.77,-4.31
F.Fab:
  lines w0.1: -0.5,1.27 0,0.563 0.5,1.27 ; -1.27,-3.81 59.69,-3.81 59.69,1.27 -1.27,1.27 -1.27,-3.81
  text "'.Designator'" at 25.163,-3.95 h1

## Samtec_HLE-125-02-xx-DV-PE-LC_2x25_P2.54mm_Horizontal [mm]
pads (102):
  rrect19% 1.31x1.31 hole 0.71: 1(0,0)
  round 1.31 hole 0.71: 2(0,-7.62) 3(2.54,0) 4(2.54,-7.62) 5(5.08,0) 6(5.08,-7.62) 7(7.62,0) 8(7.62,-7.62) 9(10.16,0) 10(10.16,-7.62) 11(12.7,0) 12(12.7,-7.62) 13(15.24,0) 14(15.24,-7.62) 15(17.78,0) 16(17.78,-7.62) 17(20.32,0) 18(20.32,-7.62) 19(22.86,0) 20(22.86,-7.62) 21(25.4,0) 22(25.4,-7.62) 23(27.94,0) 24(27.94,-7.62) 25(30.48,0) 26(30.48,-7.62) 27(33.02,0) 28(33.02,-7.62) 29(35.56,0) 30(35.56,-7.62) 31(38.1,0) 32(38.1,-7.62) 33(40.64,0) 34(40.64,-7.62) 35(43.18,0) 36(43.18,-7.62) 37(45.72,0) 38(45.72,-7.62) 39(48.26,0) 40(48.26,-7.62) 41(50.8,0) 42(50.8,-7.62) 43(53.34,0) 44(53.34,-7.62) 45(55.88,0) 46(55.88,-7.62) 47(58.42,0) 48(58.42,-7.62) 49(60.96,0) 50(60.96,-7.62)
  round 1.4 hole 1.4: Un1(27.94,-2.54) Un2(10.16,-5.08) Un3(10.16,-2.54) Un4(38.1,-2.54) Un5(12.7,-2.54) Un6(60.96,-2.54) Un7(43.18,-2.54) Un8(22.86,-2.54) Un9(15.24,-5.08) Un10(7.62,-5.08) Un11(43.18,-5.08) Un12(5.08,-2.54) Un13(60.96,-5.08) Un14(12.7,-5.08) Un16(58.42,-5.08) Un17(15.24,-2.54) Un18(0,-2.54) Un19(5.08,-5.08) Un20(53.34,-2.54) Un21(17.78,-2.54) Un22(48.26,-2.54) Un23(7.62,-2.54) Un24(40.64,-5.08) Un25(38.1,-5.08) Un26(35.56,-5.08) Un27(45.72,-2.54) Un28(58.42,-2.54) Un29(50.8,-2.54) Un30(45.72,-5.08) Un31(53.34,-5.08) Un32(20.32,-2.54) Un33(27.94,-5.08) Un34(33.02,-2.54) Un35(17.78,-5.08) Un36(55.88,-2.54) Un37(20.32,-5.08) Un38(25.4,-5.08) Un39(35.56,-2.54) Un40(2.54,-5.08) Un42(30.48,-2.54) Un43(33.02,-5.08) Un44(50.8,-5.08) Un45(0,-5.08) Un46(55.88,-5.08) Un47(30.48,-5.08) Un48(48.26,-5.08) Un49(22.86,-5.08) Un50(2.54,-2.54) Un51(25.4,-2.54) Un52(40.64,-2.54)
  round 1.19 hole 1.19: Un15(59.69,-3.81) Un41(1.27,-3.81)
F.SilkS:
  lines w0.12: -1.38,-6.46 62.34,-6.46 62.34,-1.16 -1.38,-1.16 -1.38,-6.46
F.CrtYd:
  lines w0.05: -1.77,-8.78 62.73,-8.78 62.73,1.16 -1.77,1.16 -1.77,-8.78
F.Fab:
  lines w0.1: -0.5,-1.27 0,-1.977 0.5,-1.27 ; -1.27,-6.35 62.23,-6.35 62.23,-1.27 -1.27,-1.27 -1.27,-6.35
  text "'.Designator'" at 26.433,-6.49 h1